# Altium footprint library HeadersPin_1rows_M_90.PcbLib: 40 footprints (part 1 of 3)
Each footprint in its own frame and in the unit in brackets; x right, y up, seen from the top. Pads: shape width x height; smd on the part's side, far side on the other; paste and mask are expansions set on the pad; w line width, h text height; cw(c..) or ccw(c..) is an arc to the next point about the centre after c.
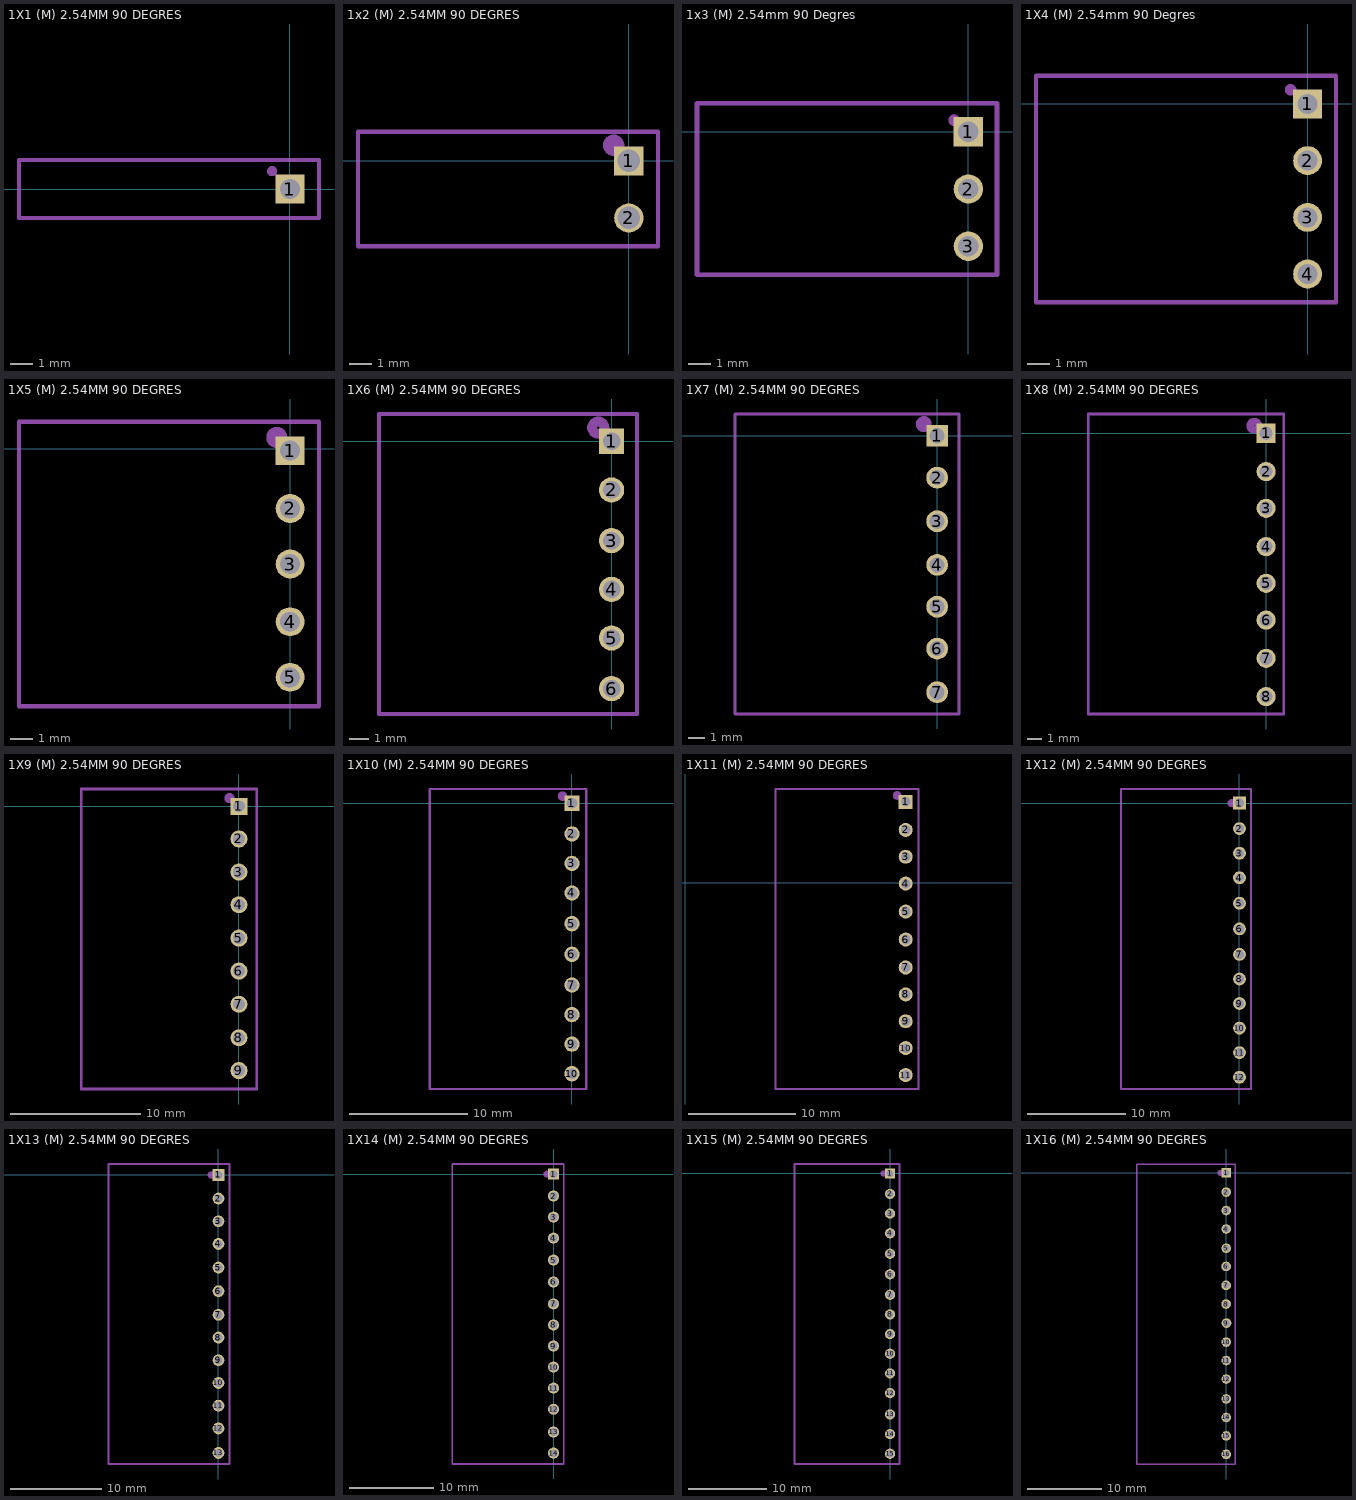
[diagram p0: the footprints below, top view; thin cyan lines are the x and y axes]

## 1X1 (M) 2.54MM 90 DEGRES [mm]
pads (1):
  rect 1.3x1.3 hole 0.9 mask+0.05: 1(0,0)
Mechanical 2:
  circle w0.254: c-0.8,0.8 r0.1
  lines w0.2: -12.141,-1.3 -12.141,1.3 1.3,1.3 1.3,-1.3 -12.141,-1.3
  text ".Designator" at 1.252,-1.255 h1.52
3D body "1x1 Male Pin Header Angle.STEP": height 2.65, standoff -2.85, extent -12.064,-1.27 0.296,1.275

## 1x2 (M) 2.54MM 90 DEGRES [mm]
pads (2):
  rect 1.3x1.3 hole 1 mask+0.05: 1(0,0)
  round 1.3 hole 1 mask+0.05: 2(0,-2.54)
Mechanical 2:
  circle w0.5: c-0.676,0.7 r0.224
  lines w0.2: -12.065,-3.8 -12.065,1.3 1.3,1.3 1.3,-3.8 -12.065,-3.8
  text ".Designator" at -4.679,-3.348 h1
3D body "1x2 Male Pin Header Angle.STEP": height 2.65, standoff -2.85, extent -12.028,-3.772 0.332,1.313

## 1x3 (M) 2.54mm 90 Degres [mm]
pads (3):
  rect 1.3x1.3 hole 0.9 mask+0.05: 1(0,0)
  round 1.3 hole 0.9 mask+0.05: 2(0,-2.54) 3(0,-5.08)
Mechanical 2:
  circle w0.254: c-0.635,0.508 r0.127
  lines w0.2: -12.037,-6.35 -12.037,1.27 1.27,1.27 1.27,-6.35 -12.037,-6.35
  text ".Designator" at -3.287,-5.839 h1
3D body "1x3 Male Pin Header Angle.STEP": height 2.65, standoff -2.85, extent -12.017,-6.281 0.343,1.344

## 1X4 (M) 2.54mm 90 Degres [mm]
pads (4):
  rect 1.3x1.3 hole 0.9 mask+0.05: 1(0,0)
  round 1.3 hole 0.9 mask+0.05: 2(0,-2.54) 3(0,-5.08) 4(0,-7.62)
Mechanical 2:
  circle w0.254: c-0.762,0.635 r0.127
  lines w0.2: -12.167,-8.89 -12.167,1.27 1.27,1.27 1.27,-8.89 -12.167,-8.89
  text ".Designator" at -3.01,-8.926 h1.52
3D body "1x4 Male Pin Header Angle.STEP": height 2.65, standoff -2.85, extent -12.096,-8.938 0.264,1.227

## 1X5 (M) 2.54MM 90 DEGRES [mm]
pads (5):
  rect 1.3x1.3 hole 0.9 mask+0.05: 1(0,-0.1)
  round 1.3 hole 0.9 mask+0.05: 2(0,-2.7) 3(0,-5.2) 4(0,-7.8) 5(0,-10.3)
Mechanical 2:
  circle w0.5: c-0.6,0.5 r0.224
  lines w0.2: -12.207,-11.6 -12.207,1.2 1.3,1.2 1.3,-11.6 -12.207,-11.6
  text ".Designator" at -3.955,-11.262 h1.52
3D body "1x5 Male Pin Header Angle.STEP": height 2.65, standoff -2.85, extent -12.103,-11.613 0.257,1.092

## 1X6 (M) 2.54MM 90 DEGRES [mm]
pads (6):
  rect 1.3x1.3 hole 0.9 mask+0.05: 1(0,0)
  round 1.3 hole 0.9 mask+0.05: 2(0,-2.5) 3(0,-5.1) 4(0,-7.6) 5(0,-10.1) 6(0,-12.7)
Mechanical 2:
  circle w0.5: c-0.684,0.7 r0.316
  lines w0.2: -11.933,-14 1.3,-14 1.3,1.4 -11.933,1.4 -11.933,-14
  text ".Designator" at -4.899,-12.337 h1.52
3D body "1x6 Male Pin Header Angle.STEP": height 2.65, standoff -2.85, extent -11.949,-13.975 0.411,1.27

## 1X7 (M) 2.54MM 90 DEGRES [mm]
pads (7):
  rect 1.3x1.3 hole 0.9 mask+0.05: 1(0,0)
  round 1.3 hole 0.9 mask+0.05: 2(0,-2.5) 3(0,-5.1) 4(0,-7.7) 5(0,-10.2) 6(0,-12.7) 7(0,-15.3)
Mechanical 2:
  circle w0.5: c-0.8,0.7 r0.224
  lines w0.2: -12.062,-16.6 1.3,-16.6 1.3,1.3 -12.062,1.3 -12.062,-16.6
  text ".Designator" at -5.684,-15.644 h1.52
3D body "1x7 Male Pin Header Angle.STEP": height 2.65, standoff -2.85, extent -12.076,-16.548 0.284,1.237

## 1X8 (M) 2.54MM 90 DEGRES [mm]
pads (8):
  rect 1.3x1.3 hole 0.9 mask+0.05: 1(-0.003,-0.013)
  round 1.3 hole 0.9 mask+0.05: 2(0,-2.614) 3(0,-5.114) 4(0,-7.714) 5(0,-10.214) 6(0,-12.714) 7(0,-15.314) 8(0,-17.914)
Mechanical 2:
  circle w0.5: c-0.8,0.5 r0.283
  lines w0.2: -12.093,-19.1 1.2,-19.1 1.2,1.3 -12.093,1.3 -12.093,-19.1
  text ".Designator" at -3.927,-13.602 h1.52
3D body "1x8 Male Pin Header Angle.STEP": height 2.65, standoff -2.85, extent -12.065,-19.08 0.295,1.245

## 1X9 (M) 2.54MM 90 DEGRES [mm]
pads (9):
  rect 1.3x1.3 hole 0.9 mask+0.05: 1(0,0)
  round 1.3 hole 0.9 mask+0.05: 2(0,-2.502) 3(0,-5.044) 4(0,-7.546) 5(0,-10.104) 6(0,-12.631) 7(0,-15.179) 8(0,-17.75) 9(0,-20.259)
Mechanical 2:
  circle w0.5: c-0.731,0.628 r0.141
  lines w0.2: -12.095,-21.672 -12.095,1.328 1.369,1.328 1.369,-21.672 -12.095,-21.672
  text ".Designator" at -6.258,-15.169 h1.52
3D body "1x9 Male Pin Header Angle.STEP": height 2.65, standoff -2.85, extent -12.025,-21.532 0.335,1.333

## 1X10 (M) 2.54MM 90 DEGRES [mm]
pads (10):
  rect 1.3x1.3 hole 0.9 mask+0.05: 1(0,0)
  round 1.3 hole 0.9 mask+0.05: 2(0,-2.6) 3(0,-5.1) 4(0,-7.6) 5(0,-10.2) 6(0,-12.8) 7(0,-15.4) 8(0,-17.9) 9(0,-20.4) 10(0,-22.9)
Mechanical 2:
  circle w0.4: c-0.8,0.6 r0.2
  lines w0.2: -12.027,-24.2 1.2,-24.2 1.2,1.2 -12.027,1.2 -12.027,-24.2
  text ".Designator" at -5.296,-17.031 h1.52
3D body "1x10 Male Pin Header Angle.STEP": height 2.65, standoff -2.85, extent -12.03,-24.221 0.33,1.184

## 1X11 (M) 2.54MM 90 DEGRES [mm]
pads (11):
  rect 1.3x1.3 hole 0.9 mask+0.05: 1(20.5,7.5)
  round 1.3 hole 0.9 mask+0.05: 2(20.5,4.9) 3(20.5,2.4) 4(20.5,-0.1) 5(20.5,-2.7) 6(20.5,-5.3) 7(20.5,-7.9) 8(20.5,-10.4) 9(20.5,-12.9) 10(20.5,-15.4) 11(20.5,-17.9)
Mechanical 2:
  circle w0.4: c19.7,8.1 r0.2
  lines w0.2: 8.379,-19.2 8.379,8.7 21.7,8.7 21.7,-19.2 8.379,-19.2
  text ".Designator" at 15.789,-9.878 h1.52
3D body "1x11 Male Pin Header Angle.STEP": height 2.65, standoff -2.85, extent 8.453,-19.131 20.813,8.814

## 1X12 (M) 2.54MM 90 DEGRES [mm]
pads (12):
  rect 1.3x1.3 hole 0.9 mask+0.05: 1(0,0)
  round 1.3 hole 0.9 mask+0.05: 2(0,-2.6) 3(0,-5.1) 4(0,-7.6) 5(0,-10.2) 6(0,-12.8) 7(0,-15.4) 8(0,-17.9) 9(0,-20.4) 10(0,-22.9) 11(0,-25.4) 12(0,-27.9)
Mechanical 2:
  circle w0.4: c-0.8,0 r0.2
  lines w0.2: -12.078,-29.1 1.2,-29.1 1.2,1.435 -12.078,1.435 -12.078,-29.1
  text ".Designator" at -5.09,-17.798 h1.52
3D body "1x12 Male Pin Header Angle.STEP": height 2.65, standoff -2.85, extent -12.101,-29.134 0.259,1.351

## 1X13 (M) 2.54MM 90 DEGRES [mm]
pads (13):
  rect 1.3x1.3 hole 0.9 mask+0.05: 1(0,0)
  round 1.3 hole 0.9 mask+0.05: 2(0,-2.6) 3(0,-5.1) 4(0,-7.6) 5(0,-10.2) 6(0,-12.8) 7(0,-15.4) 8(0,-17.9) 9(0,-20.4) 10(0,-22.9) 11(0,-25.4) 12(0,-27.9) 13(0,-30.6)
Mechanical 2:
  circle w0.4: c-0.8,0 r0.2
  lines w0.2: -12.095,-31.819 1.2,-31.819 1.2,1.2 -12.095,1.2 -12.095,-31.819
  text ".Designator" at -4.386,-17.175 h1.52
3D body "1x13 Male Pin Header Angle.STEP": height 2.65, standoff -2.85, extent -12.035,-31.783 0.325,1.242

## 1X14 (M) 2.54MM 90 DEGRES [mm]
pads (14):
  rect 1.3x1.3 hole 0.9 mask+0.05: 1(0,0)
  round 1.3 hole 0.9 mask+0.05: 2(0,-2.6) 3(0,-5.1) 4(0,-7.6) 5(0,-10.2) 6(0,-12.8) 7(0,-15.4) 8(0,-17.9) 9(0,-20.4) 10(0,-22.9) 11(0,-25.4) 12(0,-27.9) 13(0,-30.6) 14(0,-33.1)
Mechanical 2:
  circle w0.4: c-0.8,0 r0.2
  lines w0.2: -12.004,-34.4 1.2,-34.4 1.2,1.2 -12.004,1.2 -12.004,-34.4
  text ".Designator" at -5.026,-29.362 h1.52
3D body "1x14 Male Pin Header Angle.STEP": height 2.65, standoff -2.85, extent -12.06,-34.3 0.3,1.265

## 1X15 (M) 2.54MM 90 DEGRES [mm]
pads (15):
  rect 1.3x1.3 hole 0.9 mask+0.05: 1(0,0)
  round 1.3 hole 0.9 mask+0.05: 2(0,-2.6) 3(0,-5.1) 4(0,-7.6) 5(0,-10.2) 6(0,-12.8) 7(0,-15.4) 8(0,-17.9) 9(0,-20.4) 10(0,-22.9) 11(0,-25.4) 12(0,-27.9) 13(0,-30.6) 14(0,-33.1) 15(0,-35.6)
Mechanical 2:
  circle w0.4: c-0.8,0 r0.2
  lines w0.2: -12.136,-36.9 1.2,-36.9 1.2,1.2 -12.136,1.2 -12.136,-36.9
  text ".Designator" at -5.862,-20.856 h1.52
3D body "1x15 Male Pin Header Angle.STEP": height 2.65, standoff -2.85, extent -12.069,-36.883 0.291,1.222

## 1X16 (M) 2.54MM 90 DEGRES [mm]
pads (16):
  rect 1.3x1.3 hole 0.9 mask+0.05: 1(0,0)
  round 1.3 hole 0.9 mask+0.05: 2(0,-2.6) 3(0,-5.1) 4(0,-7.6) 5(0,-10.2) 6(-0.018,-12.662) 7(-0.018,-15.225) 8(-0.013,-17.76) 9(0.033,-20.33) 10(0,-22.9) 11(0,-25.4) 12(0,-27.9) 13(0,-30.6) 14(0,-33.1) 15(0,-35.6) 16(0,-38.1)
Mechanical 2:
  circle w0.4: c-0.8,0 r0.2
  lines w0.2: -12.095,-39.4 -12.095,1.2 1.2,1.2 1.2,-39.4 -12.095,-39.4
  text ".Designator" at -5.131,-23.726 h1.52
3D body "1x16 Male Pin Header Angle.STEP": height 2.65, standoff -2.85, extent -12.063,-39.367 0.297,1.278